# Altium footprint library Electronic Devices_LIB.PcbLib: 410 footprints (part 25 of 26)
Each footprint in its own frame and in the unit in brackets; x right, y up, seen from the top. Pads: shape width x height; smd on the part's side, far side on the other; paste and mask are expansions set on the pad; w line width, h text height; cw(c..) or ccw(c..) is an arc to the next point about the centre after c.
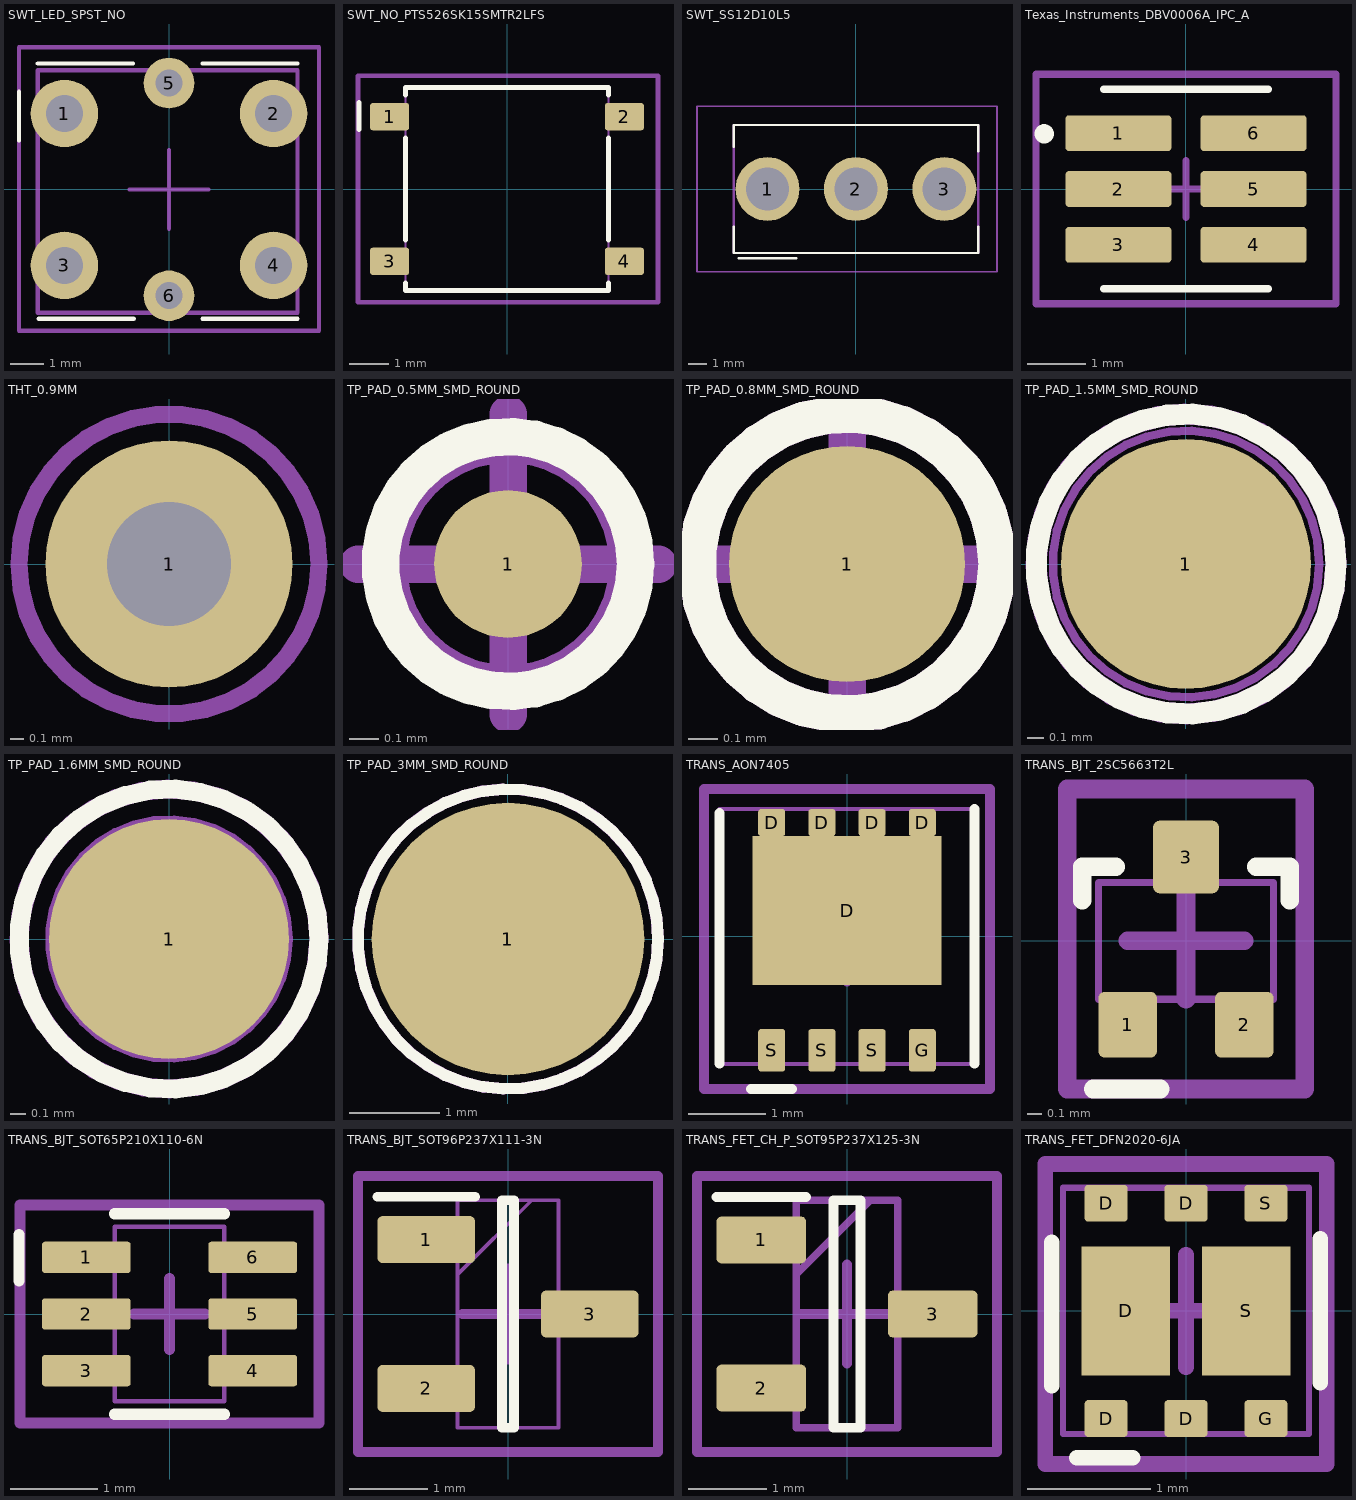
[diagram p24: the footprints below, top view; thin cyan lines are the x and y axes]

## SWT_LED_SPST_NO [mm] "Tactile Switches 180gf, Blue LED 7.2x6.8x7.0mm, THT"
height 7
pads (6):
  round 2 hole 1.1: 1(-3.1,2.25) 2(3.1,2.25) 3(-3.1,-2.25) 4(3.1,-2.25)
  round 1.5 hole 0.8: 5(0,3.15) 6(0,-3.15)
Top Overlay:
  lines w0.127: -4.445,1.448 -4.445,2.896 ; -3.886,3.734 -1.067,3.734 ; -3.861,-3.835 -1.041,-3.835 ; 0.991,-3.835 3.81,-3.835 ; 0.991,3.734 3.81,3.734
Top Assembly:
  lines w0.127: -3.886,-3.658 3.81,-3.658 3.81,3.531 -3.886,3.531 -3.886,-3.658
  text ".Designator" at -2.616,-0.11 h0.51
Top Courtyard:
  lines w0.127: -1.168,0 0,0 ; 0,-1.168 0,0 ; 0,1.168 0,0 ; 1.168,0 0,0 ; -4.445,-4.191 4.445,-4.191 4.445,-3.302 4.445,4.216 -4.445,4.216 -4.445,-4.191
3D body "ILS_TC180_40.stp": height 9.7, standoff -2.8, extent -3.878,-3.669 3.827,3.531

## SWT_NO_PTS526SK15SMTR2LFS [mm] "TACT 5.2 X 5.2 mm"
height 1.5
pads (4):
  rrect20% 1x0.7 smd: 1(-3,1.85) 2(3,1.85) 3(-3,-1.85) 4(3,-1.85)
Top Overlay:
  lines w0.127: -3.785,1.524 -3.785,2.21 ; -2.6,-2.4 -2.6,-2.6 2.6,-2.6 2.6,-2.4 ; -2.6,-1.3 -2.6,1.3 ; -2.6,2.4 -2.6,2.6 2.6,2.6 2.6,2.4 ; 2.6,-1.3 2.6,1.3
Top Assembly:
  text ".Designator" at -2.667,-0.11 h0.51
Top Courtyard:
  lines w0.127: -3.81,-2.896 3.861,-2.896 3.861,2.896 -3.81,2.896 -3.81,-2.896
Top 3D Body:
  lines w0.051: -2.6,-2.6 2.6,-2.6 2.6,2.6 -2.6,2.6 -2.6,-2.6
3D body "PTS526_SK15_SMTR2_LFS.stp": height 1.55, standoff 0, extent -3.2,-2.6 3.2,2.6

## SWT_SS12D10L5 [mm] "13mm x 6.8mm, pitch 4.7mm"
height 15.3
pads (3):
  round 3.4 hole 2.3: 1(-4.7,0) 2(0,0) 3(4.7,0)
Top Overlay:
  lines w0.127: -6.224,-3.683 -3.176,-3.683 ; -6.5,-3.4 -6.5,-2 -6.5,-3.4 ; -6.5,-3.4 6.5,-3.4 ; -6.5,-3.4 6.5,-3.4 ; -6.5,3.4 6.5,3.4 ; -6.5,3.4 6.5,3.4 ; -6.5,3.4 -6.5,2.25 -6.5,3.4 ; 6.5,-3.4 6.5,-2 6.5,-3.4 ; 6.5,3.4 6.5,2 6.5,3.4
Bottom Component Center:
  lines w0.127: -0.889,0 0,0 ; 0,-0.889 0,0 ; 0,0.889 0,0 ; 0.889,0 0,0
Top Assembly:
  circle w0.127: c-4.699,0 r0.359
  lines w0.127: -6.5,-3.4 -6.5,3.4 6.5,3.4 6.5,-3.4 -6.5,-3.4
Top Courtyard:
  lines w0.127: -6.5,-3.4 -6.5,3.4 6.5,3.4 6.5,-3.4 -6.5,-3.4
Top Component Center:
  text ".Designator" at -5.284,-0.246 h1.02
Mechanical 20:
  lines w0.1: -8.45,-4.4 -8.45,4.4 7.5,4.4 7.5,-4.4 -8.45,-4.4
3D body "SS-12D10L5.stp": height 11.4, standoff -6.9, extent -6.5,-3.4 6.5,3.4

## Texas_Instruments_DBV0006A_IPC_A [mm]
pads (6):
  rrect20% 1.805x0.61 smd: 1(-1.15,0.95) 2(-1.15,0) 3(-1.15,-0.95) 4(1.15,-0.95) 5(1.15,0) 6(1.15,0.95)
Top Overlay:
  circle w0.25: c-2.413,0.94 r0.038
  lines w0.127: -1.4,-1.7 1.4,-1.7 ; -1.4,1.7 1.4,1.7
Top Assembly:
  text ".Designator" at -2.515,-0.161 h0.51
Top Courtyard:
  lines w0.127: -0.483,0 0,0 ; 0,-0.483 0,0 ; 0,0.483 0,0 ; 0.483,0 0,0 ; -2.553,-1.95 -2.553,1.95 2.553,1.95 2.553,-1.95 -2.553,-1.95
3D body "IC_Texas_Instruments_TLV2780IDBVR_eec.STEP": height 0.25, standoff 0, extent -2.553,-1.95 2.553,1.95

## THT_0.9MM [mm] "Hole of 0.9mm , 1.8mm AR"
pads (1):
  round 1.8 hole 0.9: 1(0,0)
Top Assembly:
  text ".Designator" at -2.464,-0.11 h0.51
Top Courtyard:
  circle w0.127: c0,0 r1.091
  lines w0.127: -0.483,0 -0.051,0 ; 0,-0.483 0,-0.051 ; 0,0 0,0.432 ; 0.051,0 0.483,0

## TP_PAD_0.5MM_SMD_ROUND [mm] "Test Point, round, 0.5mm diameter, smd pad"
pads (1):
  round 0.5 smd paste-1.524: 1(0,0)
Top Overlay:
  circle w0.127: c0,0 r0.432
Top Assembly:
  circle w0.051: c0,0 r0.432
  text ".Designator" at -2.616,-0.186 h0.51
Top Courtyard:
  circle w0.127: c0,0 r0.406
  lines w0.127: -0.508,0 0,0 ; 0,-0.508 0,0 ; 0,0.508 0,0 ; 0.508,0 0,0

## TP_PAD_0.8MM_SMD_ROUND [mm] "Test Point, round, 0.8mm diameter, smd pad"
pads (1):
  round 0.8 smd paste-1.524: 1(0,0)
Top Overlay:
  circle w0.127: c0,0 r0.508
Top Assembly:
  circle w0.051: c0,0 r0.508
  text ".Designator" at -2.616,-0.186 h0.51
Top Courtyard:
  circle w0.127: c0,0 r0.508
  lines w0.127: -0.508,0 0,0 ; 0,-0.508 0,0 ; 0,0.508 0,0 ; 0.508,0 0,0

## TP_PAD_1.5MM_SMD_ROUND [mm] "Test Point, round, 1.5mm diameter, smd pad"
pads (1):
  round 1.5 smd paste-1.524: 1(0,0)
Top Overlay:
  circle w0.127: c0,0 r0.9
Top Assembly:
  circle w0.051: c0,0 r0.8
  text ".Designator" at -2.616,-0.186 h0.51
Top Courtyard:
  lines w0.127: -0.508,0 0,0 ; 0,-0.508 0,0 ; 0,0.508 0,0 ; 0.508,0 0,0 ; 0.9,0 cw(c0,0) 0.9,0.013

## TP_PAD_1.6MM_SMD_ROUND [mm] "Test Point, round, 1.6mm diameter, smd pad"
pads (1):
  round 1.6 smd paste-1.524: 1(0,0)
Top Overlay:
  circle w0.127: c0,0 r1
Top Assembly:
  circle w0.051: c0,0 r0.8
  text ".Designator" at -2.489,-0.212 h0.51
Top Courtyard:
  lines w0.127: -0.508,0 0,0 ; 0,-0.508 0,0 ; 0,0.508 0,0 ; 0.508,0 0,0 ; 1,0 cw(c0,0) 1,0.015

## TP_PAD_3MM_SMD_ROUND [mm] "Test Point, round, 3mm diameter, smd pad"
pads (1):
  round 3 smd paste-1.524: 1(0,0)
Top Overlay:
  circle w0.127: c0,0 r1.651
Top Assembly:
  circle w0.127: c0,0 r1.651
  text ".Designator" at -2.489,-0.212 h0.51
Top Courtyard:
  lines w0.127: -0.508,0 0,0 ; 0,-0.508 0,0 ; 0,0.508 0,0 ; 0.508,0 0,0 ; 1.651,0 cw(c0,0) 1.651,0.024

## TRANS_AON7405 [mm]
pads (9):
  rrect20% 0.35x0.35 smd: D(-0.975,1.475) D(-0.325,1.475) D(0.325,1.475) D(0.975,1.475)
  rect 2.45x1.93 smd: D(0,0.335)
  rrect20% 0.35x0.55 smd: G(0.975,-1.475) S(-0.975,-1.475) S(-0.325,-1.475) S(0.325,-1.475)
Top Overlay:
  lines w0.127: -1.65,-1.65 -1.65,1.6 ; -1.245,-1.976 -0.711,-1.976 ; 1.65,-1.65 1.65,1.65
Top Assembly:
  lines w0.051: -1.65,-1.65 1.65,-1.65 1.65,1.65 -1.65,1.65 -1.65,-1.65
  text ".Designator" at -2.515,-0.034 h0.51
Top Courtyard:
  lines w0.127: -0.584,0 0,0 ; 0,-0.584 0,0 ; 0,0.584 0,0 ; 0.584,0 0,0 ; -1.854,-1.976 -1.854,1.91 1.854,1.91 1.854,-1.976 -1.854,-1.976
3D body "AON7405.stp": height 0.9, standoff 0, extent -1.65,-1.715 1.65,1.65

## TRANS_BJT_2SC5663T2L [mm] "SOT-723"
height 0.55
pads (3):
  rrect20% 0.4x0.45 smd: 1(-0.4,-0.575) 2(0.4,-0.575)
  rrect20% 0.45x0.5 smd: 3(0,0.575)
Top Overlay:
  lines w0.127: -0.711,0.279 -0.711,0.508 -0.483,0.508 ; -0.635,-1.016 -0.178,-1.016 ; 0.483,0.508 0.711,0.508 0.711,0.279
Top Assembly:
  lines w0.051: -0.6,-0.4 -0.6,0.4 0.6,0.4 0.6,-0.4 -0.6,-0.4
  text ".Designator" at -2.515,-0.186 h0.51
Top Courtyard:
  lines w0.127: -0.4,0 0,0 ; 0,-0.4 0,0 ; 0,0.4 0,0 ; 0.4,0 0,0 ; -0.813,-1.016 -0.813,1.041 0.813,1.041 0.813,-1.016 -0.813,-1.016
3D body "2SC5663T2L.stp": height 0.65, standoff 0, extent -0.6,-0.76 0.6,0.78

## TRANS_BJT_SOT65P210X110-6N [mm]
pads (6):
  rrect20% 1.02x0.36 smd: 1(-0.955,0.65) 2(-0.955,0) 3(-0.955,-0.65) 4(0.955,-0.65) 5(0.955,0) 6(0.955,0.65)
Top Overlay:
  lines w0.127: -1.727,0.381 -1.727,0.914 ; -0.63,-1.15 0.63,-1.15 ; -0.63,1.15 0.63,1.15
Top Assembly:
  lines w0.051: -0.63,-1 -0.63,1 0.63,1 0.63,-1 -0.63,-1
  text ".Designator" at -2.565,-0.288 h0.51
Top Courtyard:
  lines w0.127: -0.406,0 0,0 ; 0,-0.406 0,0 ; 0,0.406 0,0 ; 0.406,0 0,0 ; -1.715,-1.25 -1.715,1.25 1.715,1.25 1.715,-1.25 -1.715,-1.25
3D body "BC847BDW1T1G.STEP": height 1.1, standoff 0, extent -1.05,-1 1.05,1

## TRANS_BJT_SOT96P237X111-3N [mm]
pads (3):
  rrect20% 1.25x0.6 smd: 1(-1.05,0.955) 2(-1.05,-0.955) 3(1.05,0)
Top Overlay:
  lines w0.127: -1.675,1.505 -0.425,1.505 ; -0.075,-1.46 0.075,-1.46 0.075,1.46 -0.075,1.46 -0.075,-1.46
Top Assembly:
  lines w0.051: -0.65,0.505 0.305,1.46 ; -0.65,-1.46 0.65,-1.46 0.65,1.46 -0.65,1.46 -0.65,-1.46
  text ".Designator" at -2.489,-0.237 h0.51
Top Courtyard:
  lines w0.127: -0.584,0 0,0 ; 0,-0.584 0,0 ; 0,0.584 0,0 ; 0.584,0 0,0 ; -1.925,-1.77 1.925,-1.77 1.925,1.77 -1.925,1.77 -1.925,-1.77
3D body "KSC3265YMTF.stp": height 1.11, standoff 0, extent -1.185,-1.46 1.185,1.46

## TRANS_FET_CH_P_SOT95P237X125-3N [mm]
pads (3):
  rrect20% 1.15x0.6 smd: 1(-1.1,0.95) 2(-1.1,-0.95) 3(1.1,0)
Top Overlay:
  lines w0.127: -1.675,1.5 -0.525,1.5 ; -0.175,-1.46 0.175,-1.46 0.175,1.46 -0.175,1.46 -0.175,-1.46
Top Assembly:
  text ".Designator" at -2.667,-0.136 h0.51
Top Courtyard:
  lines w0.127: -0.635,0 0,0 ; 0,-0.635 0,0 ; 0,0.635 0,0 ; 0.635,0 0,0 ; -1.925,-1.77 1.925,-1.77 1.925,1.77 -1.925,1.77 -1.925,-1.77
Top 3D Body:
  lines w0.1: -0.65,0.51 0.3,1.46 ; -0.65,-1.46 0.65,-1.46 0.65,1.46 -0.65,1.46 -0.65,-1.46
3D body "SI2301-TP.stp": height 1.07, standoff 0, extent -1.25,-1.503 1.25,1.497

## TRANS_FET_DFN2020-6JA [mm] "DFN2020"
height 0.8
pads (8):
  rrect20% 0.35x0.3 smd mask+0: D(-0.65,-0.875) D(-0.65,0.875) D(0,-0.875) D(0,0.875) G(0.65,-0.875) S(0.65,0.875)
  rect 0.72x1.05 smd mask+0: D(-0.49,0) S(0.49,0)
Top Overlay:
  lines w0.127: -1.092,-0.61 -1.092,0.559 ; -0.889,-1.194 -0.432,-1.194 ; 1.092,-0.584 1.092,0.584
Top Solder:
  region: -0.08,-0.577 -0.903,-0.577 -0.903,0.575 -0.08,0.575
  region: 0.9,-0.577 0.08,-0.577 0.08,0.575 0.9,0.575
  region: 0.225,-1.078 -0.226,-1.078 -0.226,-0.675 0.225,-0.675
  region: 0.875,-1.077 0.426,-1.077 0.426,-0.675 0.875,-0.675
  region: -0.425,-1.079 -0.878,-1.079 -0.878,-0.675 -0.425,-0.675
  region: 0.225,0.675 -0.225,0.675 -0.225,1.075 0.225,1.075
  region: 0.875,0.676 0.426,0.676 0.426,1.075 0.875,1.075
  region: -0.425,0.676 -0.877,0.676 -0.877,1.075 -0.425,1.075
Top Assembly:
  lines w0.051: -1,-1 -1,1 1,1 1,-1 -1,-1
  text ".Designator" at -2.311,-0.136 h0.51
Top Courtyard:
  lines w0.127: -0.457,0 0,0 ; 0,-0.457 0,0 ; 0,0.457 0,0 ; 0.457,0 0,0 ; -1.143,-1.245 -1.143,1.194 1.143,1.194 1.143,-1.245 -1.143,-1.245
3D body "step_temp.STEP": height 0.65, standoff 0, extent -1,-1 1,1